# Altium schematic symbol library lib_datalogger.SchLib: 1246 symbols (part 12 of 16)
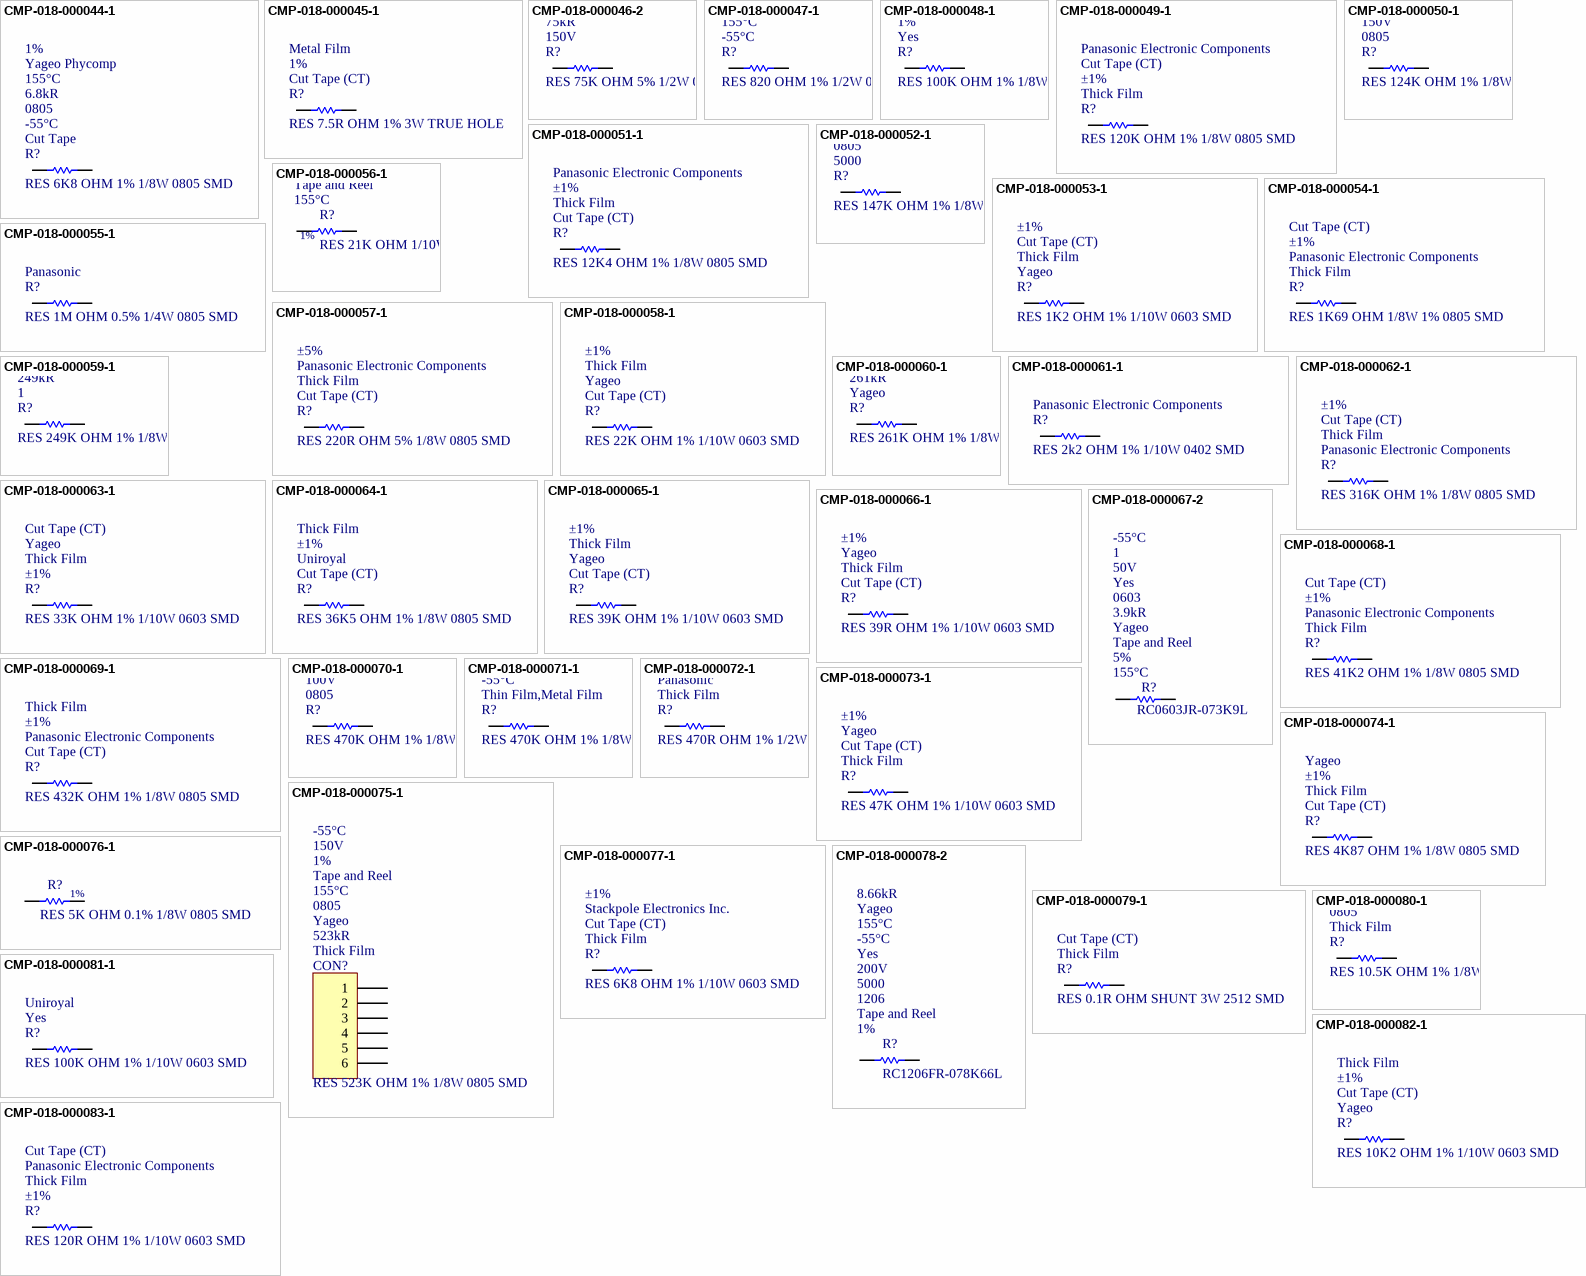
[diagram p54: symbols CMP-018-000044-1 to CMP-018-000083-1]

## CMP-018-000071-1
designator R?, comment RES 470K OHM 1% 1/8W 0805 SMD  Composition: Thin Film,Metal Film  Min Operating Temperature: -55°C  Voltage Rating: 100V  Tolerance: 0.1%  Packaging: Tape and Reel  Manufacturer: Panasonic  Case/Package: 0805  Package Quantity: 1  Max Operating Temperature: 155°C  Resistance: 470kR
RES SMD 470K OHM 1%, 0.1% 1/8W 0805; Manufacturer Part Number: ERA-6AEB474V; Max Power Dissipation: 125mW; Temperature Coefficient: 25ppm/°C; Case Code (Metric): 2012; ComponentLink6Description: https://datasheet.ciiva.com/46444/485442-46444805.pdf?src-supplier=Element14; ComponentLink9URL: https://datasheet.ciiva.com/28676/485442-28676607.pdf?src-supplier=Element14; Pricing 1: 1=0,36000, 10=0,30200, 100=0,11820, 1000=0,04948, 2500=0,04536 (USD); Contact Plating: Tin; ComponentLink5Description: https://datasheet.ciiva.com/5875/485442-5875541.pdf?src-supplier=Farnell; Height: 0.5mm; ComponentLink2URL: https://datasheet.ciiva.com/9189/aoa0000ce26-9189398.pdf?src-supplier=Avnet; Number of Pins: 2; ComponentLink8URL: https://datasheet.ciiva.com/17205/aoa0000ce26-17205647.pdf?src-supplier=Avnet+Europe; Number of Terminations: 2; ComponentLink4Description: https://datasheet.ciiva.com/26335/458319-da-01-en-widerstand-0805-era-26335741.pdf?src-supplier=Conrad; ComponentLink1Description: http://www.yageo.com/documents/recent/PYu-RC_Group_51_RoHS_L_7.pdf; Source: mits.SchLib; RoHS: Yes; Voltage Rating (DC): 100V; ComponentLink6URL: https://datasheet.ciiva.com/46444/485442-46444805.pdf?src-supplier=Element14; Features: Automotive AEC-Q200; Mount: Surface Mount; Termination: SMD/SMT; Case Code (Imperial): 0805; Military Standard: Not; ComponentLink5URL: https://datasheet.ciiva.com/5875/485442-5875541.pdf?src-supplier=Farnell; ComponentLink2Description: https://datasheet.ciiva.com/9189/aoa0000ce26-9189398.pdf?src-supplier=Avnet; Depth: 1.25mm; ComponentLink9Description: https://datasheet.ciiva.com/28676/485442-28676607.pdf?src-supplier=Element14; Width: 1.25mm; ComponentLink3Description: https://datasheet.ciiva.com/11808/0900766b80eb1d8c-11808090.pdf?src-supplier=RSComponents; ComponentLink3URL: https://datasheet.ciiva.com/11808/0900766b80eb1d8c-11808090.pdf?src-supplier=RSComponents; REACH SVHC: No SVHC; Design Item ID: RES 470K OHM 1% 1/8W 0805 SMD; Category: Chip SMD Resistors; ComponentLink7Description: https://datasheet.ciiva.com/30177/54aoa0000ce26-30177306.pdf?src-supplier=Onlinecomponents.com; Stock 1: 32083; ComponentLink4URL: https://datasheet.ciiva.com/26335/458319-da-01-en-widerstand-0805-era-26335741.pdf?src-supplier=Conrad; Power Rating: 125mW; ComponentLink1URL: http://www.yageo.com/documents/recent/PYu-RC_Group_51_RoHS_L_7.pdf; ComponentLink8Description: https://datasheet.ciiva.com/17205/aoa0000ce26-17205647.pdf?src-supplier=Avnet+Europe; Lead Free: Lead Free; Length: 2mm; Radiation Hardening: No; ComponentLink7URL: https://datasheet.ciiva.com/30177/54aoa0000ce26-30177306.pdf?src-supplier=Onlinecomponents.com
footprint CR1608-0603 (Chip Resistor; Body 1.6 x 0.8 mm (LxW typ))
footprint CR2012-0805 (Chip Capacitor)
pins: 1, 2

## CMP-018-000072-1
designator R?, comment RES 470R OHM 1% 1/2W 0805 SMD  Composition: Thick Film  Manufacturer: Panasonic  Case/Package: 0805  Packaging: Cut Tape  Resistance: 470R  Min Operating Temperature: -55°C  Max Operating Temperature: 155°C  Voltage Rating: 150V  Tolerance: 1%
RES SMD 470 OHM 1% 1/2W 0805; Manufacturer Part Number: ERJ-P6WF4700V; Power Rating: 500mW; Temperature Coefficient: 200ppm/°C; ComponentLink2URL: https://datasheet.ciiva.com/48531/aoa0000ce4-48531226.pdf?src-supplier=Avnet; ComponentLink5URL: https://datasheet.ciiva.com/48536/erjp-series-eng-tds-48536302.pdf?src-supplier=Distrelec; Depth: 1.25mm; RoHS: Yes; ComponentLink5Description: https://datasheet.ciiva.com/48536/erjp-series-eng-tds-48536302.pdf?src-supplier=Distrelec; Stock 1: 11464; Category: Chip SMD Resistors; Pricing 1: 1=0,54000, 10=0,41200, 100=0,17310, 1000=0,09552, 2500=0,08955 (USD); ComponentLink3Description: https://datasheet.ciiva.com/7830/1790600-7830869.pdf?src-supplier=Element14; Length: 0.079inch; REACH SVHC: No SVHC; Features: Automotive AEC-Q200; ComponentLink3URL: https://datasheet.ciiva.com/7830/1790600-7830869.pdf?src-supplier=Element14; Case Code (Imperial): 0805; ComponentLink1Description: http://www.yageo.com/documents/recent/PYu-RC_Group_51_RoHS_L_7.pdf; ComponentLink1URL: http://www.yageo.com/documents/recent/PYu-RC_Group_51_RoHS_L_7.pdf; Voltage Rating (DC): 150V; ComponentLink4URL: https://datasheet.ciiva.com/48531/aoa0000ce4-48531222.pdf?src-supplier=Avnet; Contact Plating: Tin; ComponentLink6URL: https://datasheet.ciiva.com/6138/1790600-6138383.pdf?src-supplier=Farnell; Case Code (Metric): 2012; Width: 0.049inch; Max Power Dissipation: 500mW; Height: 0.03inch; Design Item ID: RES 470R OHM 1% 1/2W 0805 SMD; Source: mits.SchLib; Number of Terminations: 2; ComponentLink6Description: https://datasheet.ciiva.com/6138/1790600-6138383.pdf?src-supplier=Farnell; ComponentLink2Description: https://datasheet.ciiva.com/48531/aoa0000ce4-48531226.pdf?src-supplier=Avnet; Termination: Flat; ComponentLink4Description: https://datasheet.ciiva.com/48531/aoa0000ce4-48531222.pdf?src-supplier=Avnet
footprint CR1608-0603 (Chip Resistor; Body 1.6 x 0.8 mm (LxW typ))
footprint CR1608-0603 (Chip Resistor; Body 1.6 x 0.8 mm (LxW typ))
pins: 1, 2

## CMP-018-000073-1
designator R?, comment RES 47K OHM 1% 1/10W 0603 SMD  Composition: Thick Film  Packaging: Cut Tape (CT)  Manufacturer: Yageo  Tolerance: ±1%
RES SMD 47K OHM 1% 1/10W 0603; Manufacturer Part Number: RC0603FR-0747KL; Temperature Coefficient: ±100ppm/°C; Power (Watts): 0.1W, 1/10W; Stock 1: 2571762; Supplier Device Package: 0603; Failure Rate: -; Height - Seated (Max): 0.022" (0.55mm); RoHS: RoHS Compliant; ComponentLink1URL: http://www.yageo.com/documents/recent/PYu-RC_Group_51_RoHS_L_7.pdf; Package / Case: 0603 (1608 Metric); Design Item ID: RES 47K OHM 1% 1/10W 0603 SMD; Features: Moisture Resistant; Pricing 1: 1=0.1, 10=0.013, 25=0.0092, 50=0.007, 100=0.0052, 250=0.00396, 500=0.00316, 1000=0.00233 (USD); Part Status: Active; Resistance (Ohms): 47k; Size / Dimension: 0.063" L x 0.031" W (1.60mm x 0.80mm); Operating Temperature: -55°C ~ 155°C; Source: mits.SchLib; Category: Resistors; ComponentLink1Description: http://www.yageo.com/documents/recent/PYu-RC_Group_51_RoHS_L_7.pdf
footprint CR1608-0603 (Chip Resistor; Body 1.6 x 0.8 mm (LxW typ))
footprint CR1608-0603 (Chip Resistor; Body 1.6 x 0.8 mm (LxW typ))
pins: 1, 2

## CMP-018-000074-1
designator R?, comment RES 4K87 OHM 1% 1/8W 0805 SMD  Packaging: Cut Tape (CT)  Composition: Thick Film  Tolerance: ±1%  Manufacturer: Yageo
RES SMD 4.87K OHM 1% 1/8W 0805; Manufacturer Part Number: RC0805FR-074K87L; Power (Watts): 0.125W, 1/8W; Temperature Coefficient: ±100ppm/°C; Category: Resistors; Part Status: Active; Pricing 1: 1=0.1, 10=0.019, 25=0.0136, 50=0.0104, 100=0.0077, 250=0.00584, 500=0.00468, 1000=0.00345 (USD); Failure Rate: -; Stock 1: 190260; ComponentLink1URL: http://www.yageo.com/documents/recent/PYu-RC_Group_51_RoHS_L_6.pdf; Height - Seated (Max): 0.024" (0.60mm); Design Item ID: RES 4K87 OHM 1% 1/8W 0805 SMD; Operating Temperature: -55°C ~ 155°C; Source: mits.SchLib; Supplier Device Package: 0805; Size / Dimension: 0.079" L x 0.049" W (2.00mm x 1.25mm); Number of Terminations: 2; RoHS: RoHS Compliant; Features: Moisture Resistant; ComponentLink1Description: http://www.yageo.com/documents/recent/PYu-RC_Group_51_RoHS_L_6.pdf; Resistance (Ohms): 4.87k; Package / Case: 0805 (2012 Metric)
footprint CR1608-0603 (Chip Resistor; Body 1.6 x 0.8 mm (LxW typ))
footprint CR2012-0805 (Chip Capacitor)
pins: 1, 2

## CMP-018-000075-1
designator CON?, comment RES 523K OHM 1% 1/8W 0805 SMD  Composition: Thick Film  Resistance: 523kR  Manufacturer: Yageo  Case/Package: 0805  Max Operating Temperature: 155°C  Packaging: Tape and Reel  Tolerance: 1%  Voltage Rating: 150V  Min Operating Temperature: -55°C
RES SMD 523K OHM 1% 1/8W 0805; Manufacturer Part Number: RC0805FR-07523KL; Temperature Coefficient: 100ppm/°C; Power Rating: 125mW; Length: 2mm; Case Code (Metric): 2012; ComponentLink1Description: https://datasheet.ciiva.com/17419/rc0805-17419919.pdf?src-supplier=Future+Electronics; RoHS: Yes; Radiation Hardening: No; Pricing 1: 1=0,10000, 10=0,04000, 100=0,01630, 1000=0,00731, 2500=0,00635 (USD); Design Item ID: RES 523K OHM 1% 1/8W 0805 SMD; Case Code (Imperial): 0805; Contact Plating: Tin,Matte; Source: mits.SchLib; Height: 0.5mm; Depth: 1.25mm; ComponentLink1URL: https://datasheet.ciiva.com/17419/rc0805-17419919.pdf?src-supplier=Future+Electronics; Military Standard: Not; Termination: SMD/SMT; Lead Free: Lead Free; Stock 1: 70000; Category: Chip SMD Resistors; Voltage Rating (DC): 150V; Width: 1.25mm
footprint CR2012-0805 (Chip Capacitor)
pins: 1, 2, 3, 4, 5, 6

## CMP-018-000076-1
designator R?, comment RES 5K OHM 0.1% 1/8W 0805 SMD
RES 5K OHM 0.1% 1/8W 0805 SMD 150V; Manufacturer Part Number 1: ARG05BTC5001N; Manufacturer 1: Viking Tech; Source: mits.SchLib; Design Item ID: RES 5K OHM 0.1% 1/8W 0805 SMD; Supplier Unit Price 1: 0,0281
footprint CR1608-0603 (Chip Resistor; Body 1.6 x 0.8 mm (LxW typ))
footprint CR2012-0805 (Chip Capacitor)
pins: 1, 2
text: 1%

## CMP-018-000077-1
designator R?, comment RES 6K8 OHM 1% 1/10W 0603 SMD  Composition: Thick Film  Packaging: Cut Tape (CT)  Manufacturer: Stackpole Electronics Inc.  Tolerance: ±1%
RES SMD 6.8K OHM 1% 1/10W 0603; Manufacturer Part Number: RMCF0603FT6K80; Temperature Coefficient: ±100ppm/°C; Power (Watts): 0.1W, 1/10W; Size / Dimension: 0.061" L x 0.031" W (1.55mm x 0.80mm); Package / Case: 0603 (1608 Metric); Number of Terminations: 2; Source: mits.SchLib; RoHS: RoHS Compliant; Height - Seated (Max): 0.022" (0.55mm); ComponentLink1Description: https://www.seielect.com/Catalog/SEI-RMCF_RMCP.pdf; Design Item ID: RES 6K8 OHM 1% 1/10W 0603 SMD; Resistance (Ohms): 6.8k; ComponentLink1URL: https://www.seielect.com/Catalog/SEI-RMCF_RMCP.pdf; Part Status: Active; Category: Resistors; Stock 1: 95405; Supplier Device Package: 0603; Failure Rate: -; Pricing 1: 1=0.1, 10=0.018, 25=0.0132, 50=0.01, 100=0.0074, 250=0.00564, 500=0.0045, 1000=0.00331 (USD); Features: Automotive AEC-Q200; Operating Temperature: -55°C ~ 155°C
footprint CR1608-0603 (Chip Resistor; Body 1.6 x 0.8 mm (LxW typ))
footprint CR1608-0603 (Chip Resistor; Body 1.6 x 0.8 mm (LxW typ))
pins: 1, 2

## CMP-018-000078-2
designator R?, comment RC1206FR-078K66L  Tolerance: 1%  Packaging: Tape and Reel  Case/Package: 1206  Package Quantity: 5000  Voltage Rating: 200V  RoHS Compliant: Yes  Min Operating Temperature: -55°C  Max Operating Temperature: 155°C  Manufacturer: Yageo  Resistance: 8.66kR
Res Thick Film 1206 8.66K Ohm 1% 1/4W ±100ppm/°C Molded SMD SMD Paper T/R; Max Power Dissipation: 250mW; MSRP: 0,00514; eVendor: Digi-Key; eVendor#: 311-8.66KFRCT-ND; eVendorPrice: 0,10; Case Code (Imperial): 1206; Part#: RC1206FR-078K66L; Contact Plating: Tin,Matte; Number of Terminations: 2; Power Rating: 250mW; Width: 0.063inch; Datasheet: http://www.yageo.com/documents/recent/PYu-RC1206_51_RoHS_L-4.pdf; Lead Free: Lead Free; Length: 0.122inch; Construction: Rectangular; Depth: 1.6mm; Size Code: 1206; Height: 0.026inch; Military Standard: Not; Series: RC; Termination: SMD/SMT; Resistor Type: Thick Film; Radiation Hardening: No; MOQ: 2500; Source: mits.SchLib; Voltage Rating (DC): 200V; Design Item ID: RES 8K66 OHM 1/4W 1% 1206 SMD; Features: Moisture Resistant; Temperature Coefficient: 100ppm/°C; Case Code (Metric): 3216
footprint CR3216-1206 (Chip Capacitor; Body 3.2 x 1.6 mm (LxW typ))
footprint CR3216-1206 (Chip Capacitor; Body 3.2 x 1.6 mm (LxW typ))
pins: 1, 2

## CMP-018-000079-1
designator R?, comment RES 0.1R OHM SHUNT 3W 2512 SMD  Composition: Thick Film  Packaging: Cut Tape (CT)
RES SMD 0.1 OHM SHUNT 3W 2512; Manufacturer Part Number 1: SY2512CFR100; Manufacturer 1: SANYEAR; Resistance (Ohms): 0.1; ComponentLink1URL: https://datasheet.lcsc.com/szlcsc/1912111437_SANYEAR-SY2512CFR100_C457144.pdf; Source: mits.SchLib; Power (Watts): 3W; Supplier Unit Price 1: 0.0474; Features: CURRENT SENSOR; Design Item ID: RES 0.1R OHM SHUNT 3W 2512 SMD; Category: Resistors; RoHS: RoHS Compliant; Part Status: Active; Package / Case: 2512; Supplier Device Package: 2512; ComponentLink1Description: datasheet
footprint CR1608-0603 (Chip Resistor; Body 1.6 x 0.8 mm (LxW typ))
footprint CR6432-2512 (Chip Resistor, 2-Leads, Body 6,35x3,20mm, IPC Medium Density)
pins: 1, 2

## CMP-018-000080-1
designator R?, comment RES 10.5K OHM 1% 1/8W 0805 SMD  Composition: Thick Film  Case/Package: 0805  Voltage Rating: 150V  Manufacturer: Panasonic  Max Operating Temperature: 155°C  Resistance: 10.5kR  Package Quantity: 5000  Min Operating Temperature: -55°C  Packaging: Tape and Reel  Tolerance: 1%
RES SMD 10.5K OHM 1% 1/8W 0805; Manufacturer Part Number: ERJ-6ENF1052V; Max Power Dissipation: 125mW; Temperature Coefficient: 100ppm/°C; ComponentLink5Description: https://datasheet.ciiva.com/9194/aoa0000ce2-9194056.pdf?src-supplier=Avnet; Number of Terminations: 2; Pricing 1: 1=0,10000, 10=0,07200, 100=0,02750, 1000=0,01210, 2500=0,01045 (USD); ComponentLink8Description: https://datasheet.ciiva.com/7829/1678782-7829327.pdf?src-supplier=Element14; Design Item ID: RES 10.5K OHM 1% 1/8W 0805 SMD; Category: Chip SMD Resistors; Height - Seated (Max): 0.028inch; Contact Plating: Tin; Case Code (Metric): 2012; ComponentLink1Description: https://datasheet.ciiva.com/11821/0900766b80f80784-11821503.pdf?src-supplier=RSComponents; Depth: 1.25mm; Height: 0.6mm; Source: mits.SchLib; ComponentLink7Description: https://datasheet.ciiva.com/46444/1678782-46444445.pdf?src-supplier=Element14; ComponentLink4URL: https://datasheet.ciiva.com/30137/aoa0000ce2-30137207.pdf?src-supplier=Onlinecomponents.com; REACH SVHC: No SVHC; ComponentLink7URL: https://datasheet.ciiva.com/46444/1678782-46444445.pdf?src-supplier=Element14; Width: 0.049inch; Length: 2mm; Voltage Rating (DC): 150V; ComponentLink3Description: https://datasheet.ciiva.com/16767/70260748-16767017.pdf?src-supplier=Allied+Electronics; Military Standard: Not; ComponentLink5URL: https://datasheet.ciiva.com/9194/aoa0000ce2-9194056.pdf?src-supplier=Avnet; ComponentLink1URL: https://datasheet.ciiva.com/11821/0900766b80f80784-11821503.pdf?src-supplier=RSComponents; ComponentLink4Description: https://datasheet.ciiva.com/30137/aoa0000ce2-30137207.pdf?src-supplier=Onlinecomponents.com; ComponentLink6URL: https://datasheet.ciiva.com/24069/aoa0000ce2-24069034.pdf?src-supplier=Mouser; ComponentLink3URL: https://datasheet.ciiva.com/16767/70260748-16767017.pdf?src-supplier=Allied+Electronics; ComponentLink2URL: https://datasheet.ciiva.com/16759/70260748-16759239.pdf?src-supplier=Allied+Electronics; Mount: Surface Mount; RoHS: Yes; Termination: SMD/SMT; Case Code (Imperial): 0805; Features: Automotive AEC-Q200; Power Rating: 125mW; ComponentLink6Description: https://datasheet.ciiva.com/24069/aoa0000ce2-24069034.pdf?src-supplier=Mouser; ComponentLink8URL: https://datasheet.ciiva.com/7829/1678782-7829327.pdf?src-supplier=Element14; Stock 1: 54240; ComponentLink2Description: https://datasheet.ciiva.com/16759/70260748-16759239.pdf?src-supplier=Allied+Electronics; Lead Free: Lead Free
footprint CR1608-0603 (Chip Resistor; Body 1.6 x 0.8 mm (LxW typ))
footprint CR2012-0805 (Chip Capacitor)
pins: 1, 2

## CMP-018-000081-1
designator R?, comment RES 100K OHM 1% 1/10W 0603 SMD  RoHS Compliant: Yes  Manufacturer: Uniroyal
CHIP RESISTOR - SURFACE MOUNT 100KOHMS ±1% 1/10W 0603 ROHS; Manufacturer Part Number: 0603WAF1003T5E; Source: mits.SchLib; Design Item ID: RES 100K OHM 1% 1/10W 0603 SMD
footprint CR1608-0603 (Chip Resistor; Body 1.6 x 0.8 mm (LxW typ))
footprint CR1608-0603 (Chip Resistor; Body 1.6 x 0.8 mm (LxW typ))
pins: 1, 2

## CMP-018-000082-1
designator R?, comment RES 10K2 OHM 1% 1/10W 0603 SMD  Manufacturer: Yageo  Packaging: Cut Tape (CT)  Tolerance: ±1%  Composition: Thick Film
RES SMD 10.2K OHM 1% 1/10W 0603; Manufacturer Part Number: RC0603FR-0710K2L; Power (Watts): 0.1W, 1/10W; Temperature Coefficient: ±100ppm/°C; Stock 1: 111714; Operating Temperature: -55°C ~ 155°C; Pricing 1: 1=0.1, 10=0.014, 25=0.01, 100=0.0057, 250=0.00436, 500=0.00348, 1000=0.00257, 2500=0.00223 (USD); Design Item ID: RES 10K2 OHM 1% 1/10W 0603 SMD; Supplier Device Package: 0603; Package / Case: 0603 (1608 Metric); Category: Resistors; Features: Moisture Resistant; RoHS: RoHS Compliant; Height: 0.022" (0.55mm); Source: mits.SchLib; Number of Terminations: 2; ComponentLink1Description: http://www.yageo.com/documents/recent/PYu-RC_Group_51_RoHS_L_04.pdf; Resistance (Ohms): 10.2k; ComponentLink1URL: http://www.yageo.com/documents/recent/PYu-RC_Group_51_RoHS_L_04.pdf; Size / Dimension: 0.063" L x 0.031" W (1.60mm x 0.80mm)
footprint CR1608-0603 (Chip Resistor; Body 1.6 x 0.8 mm (LxW typ))
footprint CR1608-0603 (Chip Resistor; Body 1.6 x 0.8 mm (LxW typ))
pins: 1, 2

## CMP-018-000083-1
designator R?, comment RES 120R OHM 1% 1/10W 0603 SMD  Tolerance: ±1%  Composition: Thick Film  Manufacturer: Panasonic Electronic Components  Packaging: Cut Tape (CT)
RES SMD 120 OHM 1% 1/10W 0603; Manufacturer Part Number: ERJ-3EKF1200V; Resistance (Ohms): 120; Power (Watts): 0.1W, 1/10W; Temperature Coefficient: ±100ppm/°C; RoHS: RoHS Compliant; Stock 1: 294651; Features: Automotive AEC-Q200; Size / Dimension: 0.063" L x 0.031" W (1.60mm x 0.80mm); Source: mits.SchLib; Package / Case: 0603 (1608 Metric); Failure Rate: -; Part Status: Active; Number of Terminations: 2; Operating Temperature: -55°C ~ 155°C; Category: Resistors; Pricing 1: 1=0.1, 10=0.019, 25=0.0136, 50=0.0104, 100=0.0077, 250=0.00584, 500=0.00468, 1000=0.00345 (USD); ComponentLink1URL: https://industrial.panasonic.com/cdbs/www-data/pdf/RDA0000/AOA0000C283.pdf; ComponentLink1Description: https://industrial.panasonic.com/cdbs/www-data/pdf/RDA0000/AOA0000C283.pdf; Supplier Device Package: 0603; Height - Seated (Max): 0.022" (0.55mm); Design Item ID: RES 120R OHM 1% 1/10W 0603 SMD
footprint CR1608-0603 (Chip Resistor; Body 1.6 x 0.8 mm (LxW typ))
footprint CR1608-0603 (Chip Resistor; Body 1.6 x 0.8 mm (LxW typ))
pins: 1, 2

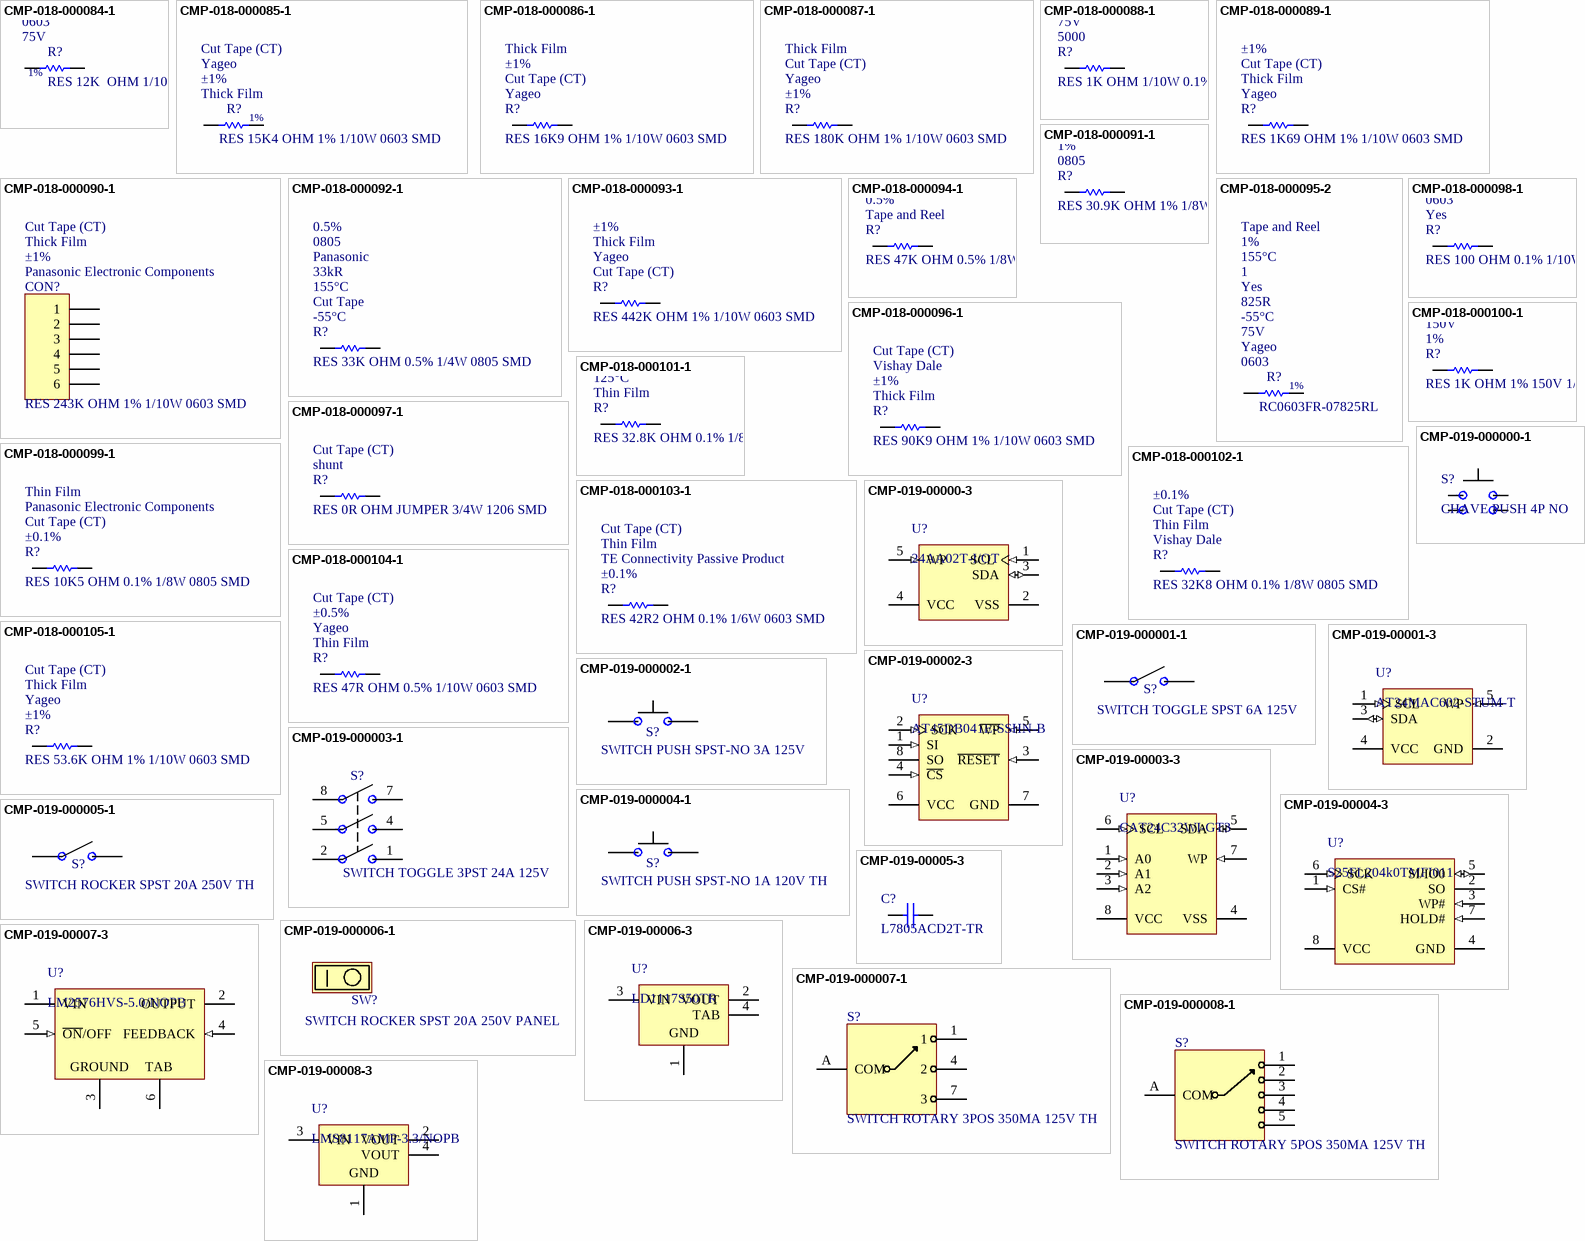
[diagram p34: symbols CMP-018-000084-1 to CMP-019-00008-3]

## CMP-018-000084-1
designator R?, comment RES 12K  OHM 1/10W 1% 0603 SMD  Voltage Rating: 75V  Case/Package: 0603  Tolerance: 5%  Package Quantity: 1  Max Operating Temperature: 155°C  Manufacturer: Uniroyal  RoHS Compliant: Yes  Min Operating Temperature: -55°C  Packaging: Tape and Reel  Resistance: 12kR
Resistor;  Thick Film;  Res 12 Kilohms;  Pwr-Rtg 0.1 W;  Tol 5%;  SMT;  0603;  Cut Tape; Manufacturer Part Number: 0603WAF1202T5E; Power Rating: 100mW; Temperature Coefficient: 200ppm/°C; Voltage Rating (DC): 50V; Category: Chip SMD Resistors; ComponentLink8Description: https://datasheet.ciiva.com/17211/aoa0000ce1-17211800.pdf?src-supplier=Avnet+Europe; REACH SVHC: No SVHC; Height: 0.45mm; Technology: THICK FILM; ComponentLink8URL: https://datasheet.ciiva.com/17211/aoa0000ce1-17211800.pdf?src-supplier=Avnet+Europe; ComponentLink4URL: https://datasheet.ciiva.com/9117/aoa0000ce1-9117062.pdf?src-supplier=Avnet; Number of Terminations: 2; ComponentLink2Description: https://datasheet.ciiva.com/34303/1988532-34303610.pdf?src-supplier=Jameco; Depth: 0.8mm; Construction: Rectangular; Series: ERJ; Military Standard: Not; ComponentLink4Description: https://datasheet.ciiva.com/9117/aoa0000ce1-9117062.pdf?src-supplier=Avnet; Lead Free: Lead Free; ComponentLink6Description: https://datasheet.ciiva.com/24023/aoa0000ce1-37422-24023237.pdf?src-supplier=Mouser; ComponentLink2URL: https://datasheet.ciiva.com/34303/1988532-34303610.pdf?src-supplier=Jameco; Case Code (Imperial): 0603; ComponentLink6URL: https://datasheet.ciiva.com/24023/aoa0000ce1-37422-24023237.pdf?src-supplier=Mouser; Pricing 2: 50=0,00790, 500=0,00590, 1500=0,00560, 5000=0,00520, 25000=0,00510, 50000=0,00500, 50=0,00760, 500=0,00570, 1500=0,00540, 5000=0,00500, 25000=0,00490, 50000=0,00480, 50=0,03920, 500=0,02940, 1500=0,02810, 5000=0,02620, 25000=0,02550, 50000=0,02490, 50=0,03780, 500=0,02840, 1500=0,02710, 5000=0,02520, 25000=0,02460, 50000=0,02400, 50=0,00510, 500=0,00380, 1500=0,00360, 5000=0,00340, 25000=0,00330, 50000=0,00320, 50=0,00440, 500=0,00330, 1500=0,00310, 5000=0,00290, 25000=0,00280, 50000=0,00280, 50=0,04660, 500=0,03500, 1500=0,03340, 5000=0,03110, 25000=0,03030, 50000=0,02950, 50=0,65770, 500=0,49330, 1500=0,47130, 5000=0,43850, 25000=0,42750, 50000=0,41650, 50=0,02490, 500=0,01870, 1500=0,01780, 5000=0,01660, 25000=0,01620, 50000=0,01580, 50=0,45610, 500=0,34210, 1500=0,32690, 5000=0,30410, 25000=0,29650, 50000=0,28890, 50=0,05180, 500=0,03890, 1500=0,03720, 5000=0,03460, 25000=0,03370, 50000=0,03280, 50=0,00810, 500=0,00610, 1500=0,00580, 5000=0,00540, 25000=0,00520, 50000=0,00510, 50=0,00600, 500=0,00450, 1500=0,00430, 5000=0,00400, 25000=0,00390, 50000=0,00380 (AUD); Stock 2: 3400; ComponentLink9URL: https://datasheet.ciiva.com/16437/aoa0000ce1-16437817.pdf?src-supplier=Future+Electronics; ComponentLink10URL: https://datasheet.ciiva.com/28590/1678796-28590971.pdf?src-supplier=Element14; ComponentLink12URL: https://datasheet.ciiva.com/16775/70255313-16775998.pdf?src-supplier=Allied+Electronics; Features: Automotive AEC-Q200; Weight: 0.0018lb; Case Code (Metric): 1608; Resistance Tolerance: 5%; Radiation Hardening: No; RoHS: No; Source: mits.SchLib; Design Item ID: RES 12K  OHM 1/10W 1% 0603 SMD; ComponentLink12Description: https://datasheet.ciiva.com/16775/70255313-16775998.pdf?src-supplier=Allied+Electronics; ComponentLink5URL: https://datasheet.ciiva.com/16514/aoa0000ce1-16514215.pdf?src-supplier=Avnet+Asia; Contact Plating: Tin; ComponentLink3URL: https://datasheet.ciiva.com/11821/0900766b80f806dd-11821411.pdf?src-supplier=RSComponents; Max Power Dissipation: 100mW; ComponentLink9Description: https://datasheet.ciiva.com/16437/aoa0000ce1-16437817.pdf?src-supplier=Future+Electronics; Mount: Surface Mount; Resistor Type: Thick Film; Width: 0.8mm; Length: 1.6mm; ComponentLink7Description: https://datasheet.ciiva.com/30265/4aoa0000ce1-30265398.pdf?src-supplier=Onlinecomponents.com; ComponentLink1URL: http://www.yageo.com/documents/recent/PYu-RC_Group_51_RoHS_L_7.pdf; ComponentLink1Description: http://www.yageo.com/documents/recent/PYu-RC_Group_51_RoHS_L_7.pdf; Termination: SMD/SMT; ComponentLink11URL: https://datasheet.ciiva.com/16782/70255313-16782319.pdf?src-supplier=Allied+Electronics; ComponentLink10Description: https://datasheet.ciiva.com/28590/1678796-28590971.pdf?src-supplier=Element14; Size Code: 0603; ComponentLink11Description: https://datasheet.ciiva.com/16782/70255313-16782319.pdf?src-supplier=Allied+Electronics; ComponentLink7URL: https://datasheet.ciiva.com/30265/4aoa0000ce1-30265398.pdf?src-supplier=Onlinecomponents.com; ComponentLink5Description: https://datasheet.ciiva.com/16514/aoa0000ce1-16514215.pdf?src-supplier=Avnet+Asia; ComponentLink3Description: https://datasheet.ciiva.com/11821/0900766b80f806dd-11821411.pdf?src-supplier=RSComponents
footprint CR1608-0603 (Chip Resistor; Body 1.6 x 0.8 mm (LxW typ))
footprint CR1608-0603 (Chip Resistor; Body 1.6 x 0.8 mm (LxW typ))
pins: 1, 2
text: 1%

## CMP-018-000085-1
designator R?, comment RES 15K4 OHM 1% 1/10W 0603 SMD  Composition: Thick Film  Tolerance: ±1%  Manufacturer: Yageo  Packaging: Cut Tape (CT)
RES SMD 15.4K OHM 1% 1/10W 0603; Manufacturer Part Number: RC0603FR-0715K4L; Temperature Coefficient: ±100ppm/°C; Power (Watts): 0.1W, 1/10W; Features: Moisture Resistant; Number of Terminations: 2; Operating Temperature: -55°C ~ 155°C; Package / Case: 0603 (1608 Metric); Size / Dimension: 0.063" L x 0.031" W (1.60mm x 0.80mm); ComponentLink1Description: http://www.yageo.com/documents/recent/PYu-RC_Group_51_RoHS_L_04.pdf; Part Status: Active; RoHS: RoHS Compliant; Stock 1: 168640; Category: Resistors; Pricing 1: 1=0.1, 10=0.014, 25=0.01, 100=0.0057, 250=0.00436, 500=0.00348, 1000=0.00257, 2500=0.00223 (USD); ComponentLink1URL: http://www.yageo.com/documents/recent/PYu-RC_Group_51_RoHS_L_04.pdf; Resistance (Ohms): 15.4k; Source: mits.SchLib; Design Item ID: RES 15K4 OHM 1% 1/10W 0603 SMD; Supplier Device Package: 0603; Height: 0.022" (0.55mm)
footprint CR1608-0603 (Chip Resistor; Body 1.6 x 0.8 mm (LxW typ))
footprint CR1608-0603 (Chip Resistor; Body 1.6 x 0.8 mm (LxW typ))
pins: 1, 2
text: 1%

## CMP-018-000086-1
designator R?, comment RES 16K9 OHM 1% 1/10W 0603 SMD  Manufacturer: Yageo  Packaging: Cut Tape (CT)  Tolerance: ±1%  Composition: Thick Film
RES SMD 16.9K OHM 1% 1/10W 0603; Manufacturer Part Number: RC0603FR-0716K9L; Power (Watts): 0.1W, 1/10W; Temperature Coefficient: ±100ppm/°C; Size / Dimension: 0.063" L x 0.031" W (1.60mm x 0.80mm); Operating Temperature: -55°C ~ 155°C; Height: 0.022" (0.55mm); RoHS: RoHS Compliant; Package / Case: 0603 (1608 Metric); Number of Terminations: 2; Design Item ID: RES 16K9 OHM 1% 1/10W 0603 SMD; Stock 1: 52478; Features: Moisture Resistant; Supplier Device Package: 0603; ComponentLink1URL: http://www.yageo.com/documents/recent/PYu-RC_Group_51_RoHS_L_04.pdf; Pricing 1: 1=0.1, 10=0.014, 25=0.01, 100=0.0057, 250=0.00436, 500=0.00348, 1000=0.00257, 2500=0.00223 (USD); Resistance (Ohms): 16.9k; Category: Resistors; Source: mits.SchLib; ComponentLink1Description: http://www.yageo.com/documents/recent/PYu-RC_Group_51_RoHS_L_04.pdf
footprint CR1608-0603 (Chip Resistor; Body 1.6 x 0.8 mm (LxW typ))
footprint CR1608-0603 (Chip Resistor; Body 1.6 x 0.8 mm (LxW typ))
pins: 1, 2

## CMP-018-000087-1
designator R?, comment RES 180K OHM 1% 1/10W 0603 SMD  Tolerance: ±1%  Manufacturer: Yageo  Packaging: Cut Tape (CT)  Composition: Thick Film